# Altium footprint library custom.PcbLib: 317 footprints (part 6 of 20)
Each footprint in its own frame and in the unit in brackets; x right, y up, seen from the top. Pads: shape width x height; smd on the part's side, far side on the other; paste and mask are expansions set on the pad; w line width, h text height; cw(c..) or ccw(c..) is an arc to the next point about the centre after c.
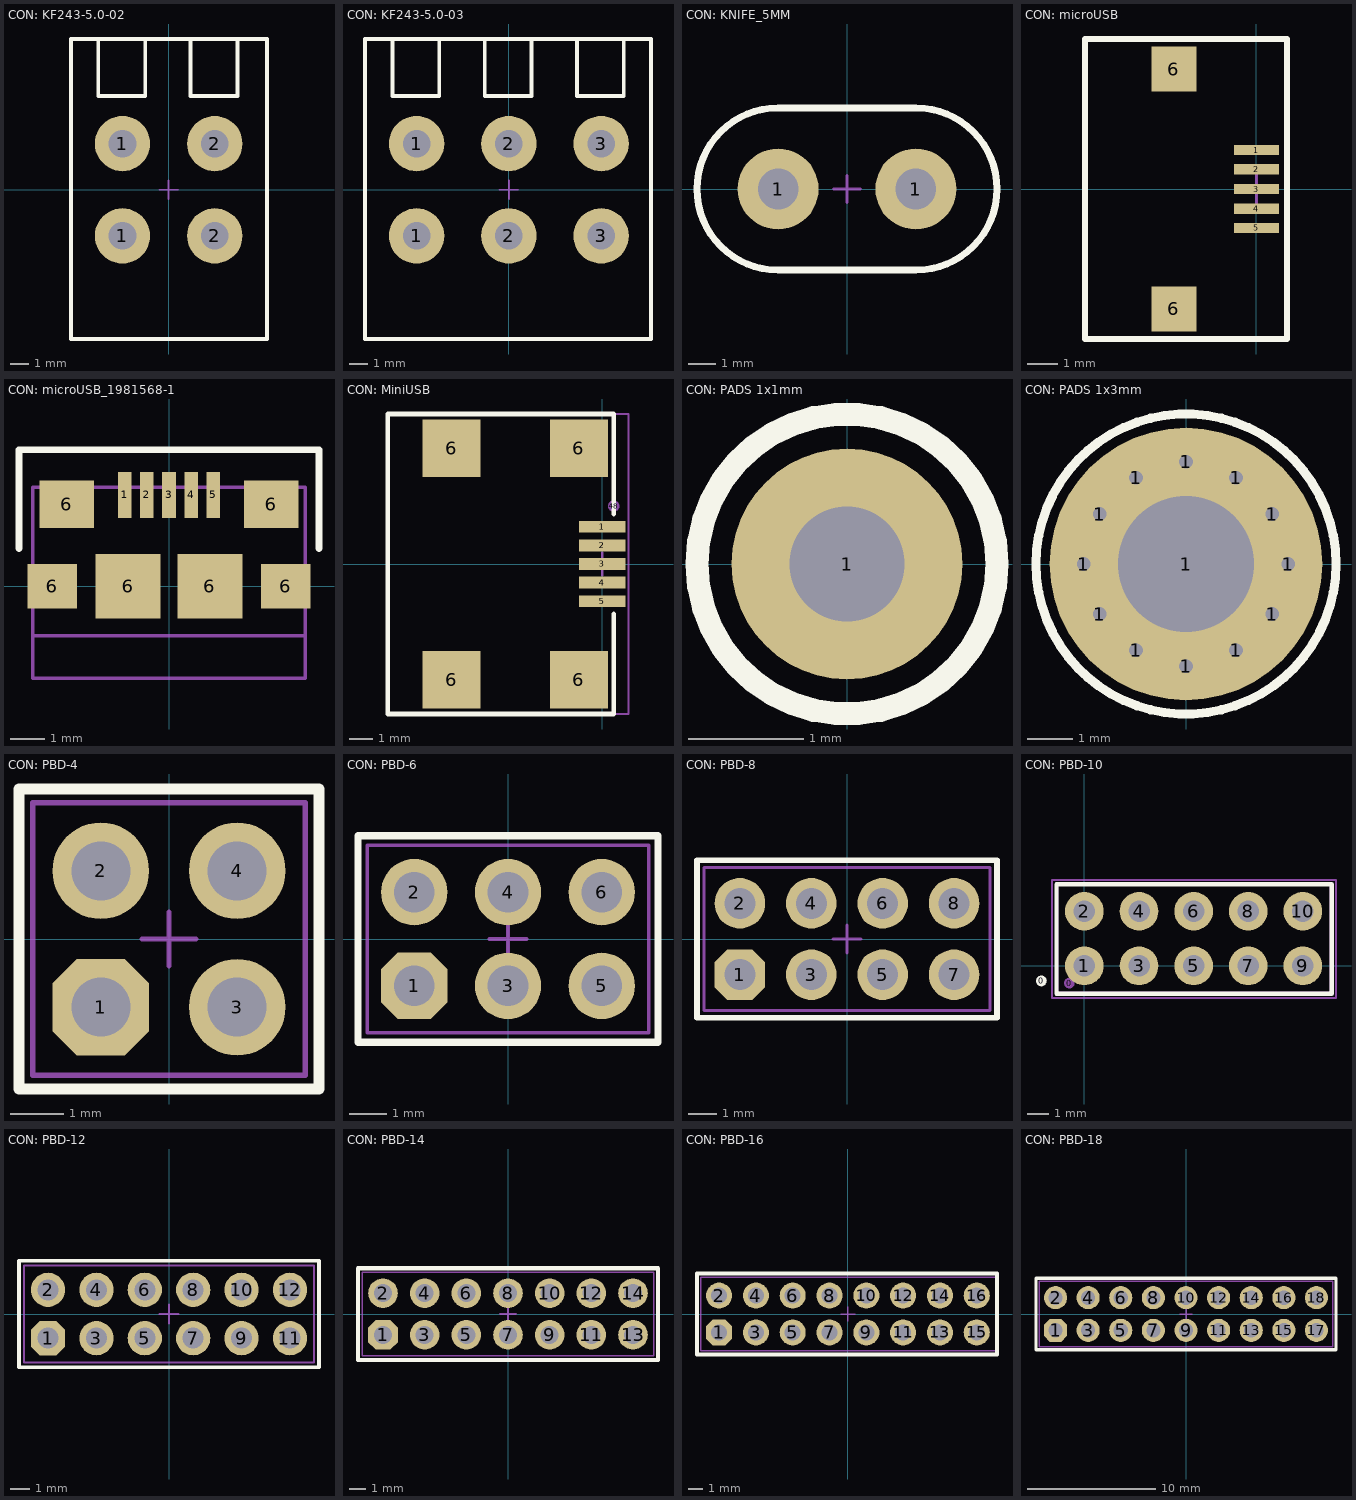
[diagram p5: the footprints below, top view; thin cyan lines are the x and y axes]

## CON: KF243-5.0-02 [mm]
height 30
pads (4):
  round 3 hole 1.5: 1(-2.5,-2.5) 1(-2.5,2.5) 2(2.5,-2.5) 2(2.5,2.5)
Top Overlay:
  lines w0.2: -3.81,8.168 -3.81,5.08 -1.27,5.08 -1.27,8.168 ; 1.19,8.168 1.19,5.08 3.73,5.08 3.73,8.168 ; -5.294,-8.088 5.334,-8.088 5.334,8.168 -5.294,8.168 -5.294,-8.088
Top Assy:
  lines w0.1: -3.81,8.168 -3.81,5.08 -1.27,5.08 -1.27,8.168 ; 1.19,8.168 1.19,5.08 3.73,5.08 3.73,8.168 ; -5.294,-8.088 -5.294,8.168 5.334,8.168 5.334,-8.088 -5.294,-8.088
Size Area:
  lines w0.1: -0.5,0 0.5,0 ; 0,-0.5 0,0.5 ; -5.294,-8.088 5.334,-8.088 5.334,8.168 -5.294,8.168 -5.294,-8.088
3D body "KF243.STEP": height 19.11, standoff 0, extent 0,-7.89 5,7.89
3D body "KF243.STEP": height 19.11, standoff 0, extent -5,-7.89 0,7.89

## CON: KF243-5.0-03 [mm]
height 30
pads (6):
  round 3 hole 1.5: 1(-5,-2.5) 1(-5,2.5) 2(0,-2.5) 2(0,2.5) 3(5,-2.5) 3(5,2.5)
Top Overlay:
  lines w0.2: -6.31,8.168 -6.31,5.08 -3.77,5.08 -3.77,8.168 ; -1.31,8.168 -1.31,5.08 1.23,5.08 1.23,8.168 ; 3.69,8.168 3.69,5.08 6.23,5.08 6.23,8.168 ; -7.794,-8.088 7.7,-8.088 7.7,8.168 -7.794,8.168 -7.794,-8.088
Top Assy:
  lines w0.1: -6.31,8.168 -6.31,5.08 -3.77,5.08 -3.77,8.168 ; -1.31,8.168 -1.31,5.08 1.23,5.08 1.23,8.168 ; 3.69,8.168 3.69,5.08 6.23,5.08 6.23,8.168 ; -7.794,-8.088 -7.794,8.168 7.7,8.168 7.7,-8.088 -7.794,-8.088
Size Area:
  lines w0.1: -0.5,0 0.5,0 ; 0,-0.5 0,0.5 ; -7.794,-8.088 7.7,-8.088 7.7,8.168 -7.794,8.168 -7.794,-8.088
3D body "KF243.STEP": height 19.11, standoff 0, extent 2.5,-7.89 7.5,7.89
3D body "KF243.STEP": height 19.11, standoff 0, extent -7.5,-7.89 -2.5,7.89
3D body "KF243.STEP": height 19.11, standoff 0, extent -2.5,-7.89 2.5,7.89

## CON: KNIFE_5MM [mm]
pads (2):
  round 3 hole 1.5: 1(-2.55,0) 1(2.55,0)
Top Overlay:
  lines w0.254: -2.55,-3 cw(c-2.55,0) -2.55,3 2.55,3 cw(c2.55,0) 2.55,-3 -2.55,-3
Top Assy:
  lines w0.05: -2.55,-3 cw(c-2.55,0) -2.55,3 2.55,3 cw(c2.55,0) 2.55,-3 -2.55,-3
Size Area:
  lines w0.05: -2.55,-3 cw(c-2.55,0) -2.55,3 2.55,3 cw(c2.55,0) 2.55,-3 -2.55,-3
  lines w0.1: -0.5,0 0.5,0 ; 0,-0.5 0,0.5
3D body "TA-M.STEP": height 10.2, standoff -3.7, extent -3.975,-0.375 3.925,0.425

## CON: microUSB [mm]
height 3
pads (7):
  rect 1.5x0.35 smd: 1(0,1.3) 2(0,0.65) 3(0,0) 4(0,-0.65) 5(0,-1.3)
  rect 1.5x1.5 smd: 6(-2.75,-4) 6(-2.75,4)
Top Overlay:
  lines w0.2: -5.715,-5 1.016,-5 1.016,5 -5.715,5 -5.715,-5
Top Assy:
  lines w0.1: -5.715,-5 1.016,-5 1.016,5 -5.715,5 -5.715,-5
Size Area:
  lines w0.1: -0.5,0 0.5,0 ; 0,-0.5 0,0.5 ; -5.715,-5 -5.715,5 1.016,5 1.016,-5 -5.715,-5
3D body "48284.stp": height 2.71, standoff -0.23, extent -5.5,-4.4 0.231,4.4

## CON: microUSB_1981568-1 [mm]
pads (11):
  rect 0.4x1.35 smd: 1(-1.3,2.675) 2(-0.65,2.675) 3(0,2.675) 4(0.65,2.675) 5(1.3,2.675)
  rect 1.45x1.3 smd: 6(-3.425,0) 6(3.425,0)
  rect 1.6x1.4 smd: 6(-3,2.4) 6(3,2.4)
  rect 1.9x1.9 smd: 6(-1.2,0) 6(1.2,0)
Top Overlay:
  lines w0.2: -4.4,1.1 -4.4,4 4.4,4 4.4,1.1
Top Assy:
  lines w0.1: -4,-1.45 4,-1.45 ; -4,-2.7 -4,2.9 4,2.9 4,-2.7 -4,-2.7
3D body "c-1981568-1-g-3d.stp": height 2.79, standoff -0.29, extent -4,-2.7 4,2.9

## CON: MiniUSB [mm] "Mini USB on-pcb connector, female"
height 4
pads (10):
  rect 2x0.5 smd: 1(0,1.6) 2(0,0.8) 3(0,0) 4(0,-0.8) 5(0,-1.6)
  rect 2.5x2.5 smd: 6(-6.5,-5) 6(-6.5,5) 6(-1,-5) 6(-1,5)
  round 0.5 on Mech1: 48(0.5,2.5)
Top Overlay:
  lines w0.2: 0.508,-2.159 0.508,-6.477 -9.25,-6.477 -9.25,6.477 0.508,6.477 0.508,2.159
Top Assy:
  lines w0.1: -9.271,-6.477 -9.271,6.477 1.143,6.477 1.143,-6.477 -9.271,-6.477
Size Area:
  lines w0.1: -0.5,0 0.5,0 ; 0,-0.5 0,0.5 ; -9.271,-6.477 1.143,-6.477 1.143,6.477 -9.271,6.477 -9.271,-6.477
3D body "1-1734035-1.stp": height 4.09, standoff -1, extent -9.4,-4.95 -0.2,4.95

## CON: PADS 1x1mm [mm]
pads (1):
  round 2 hole 1: 1(0,0)
Top Overlay:
  circle w0.2: c0,0 r1.3

## CON: PADS 1x3mm [mm]
pads (13):
  round 0.7 hole 0.3: 1(-2.25,0) 1(-1.9,-1.1) 1(-1.9,1.1) 1(-1.1,-1.9) 1(-1.1,1.9) 1(0,-2.25) 1(0,2.25) 1(1.1,-1.9) 1(1.1,1.9) 1(1.9,-1.1) 1(1.9,1.1) 1(2.25,0)
  round 6 hole 3: 1(0,0)
Top Overlay:
  circle w0.2: c0,0 r3.3

## CON: PBD-4 [mm] "PBD-4"
height 10
pads (4):
  oct 1.8x1.8 hole 1.1: 1(-1.27,-1.27)
  round 1.8 hole 1.1: 2(-1.27,1.27) 3(1.27,-1.27) 4(1.27,1.27)
Top Overlay:
  lines w0.2: -2.794,-2.794 -2.794,2.794 2.794,2.794 2.794,-2.794 -2.794,-2.794
Top Assy:
  lines w0.1: -2.54,-2.54 -2.54,2.54 2.54,2.54 2.54,-2.54 -2.54,-2.54
Size Area:
  lines w0.1: -0.5,0 0.5,0 ; 0,-0.5 0,0.5 ; -2.794,-2.794 2.794,-2.794 2.794,2.794 -2.794,2.794 -2.794,-2.794

## CON: PBD-6 [mm] "PBD-6"
height 10
pads (6):
  oct 1.8x1.8 hole 1.1: 1(-2.54,-1.27)
  round 1.8 hole 1.1: 2(-2.54,1.27) 3(0,-1.27) 4(0,1.27) 5(2.54,-1.27) 6(2.54,1.27)
Top Overlay:
  lines w0.2: -4.064,-2.794 -4.064,2.794 4.064,2.794 4.064,-2.794 -4.064,-2.794
Top Assy:
  lines w0.1: -3.81,-2.54 -3.81,2.54 3.81,2.54 3.81,-2.54 -3.81,-2.54
Size Area:
  lines w0.1: -0.5,0 0.5,0 ; 0,-0.5 0,0.5 ; -4.064,-2.794 4.064,-2.794 4.064,2.794 -4.064,2.794 -4.064,-2.794
3D body "PBD-6.STEP": height 8.5, standoff -3, extent -3.81,-2.54 3.81,2.54

## CON: PBD-8 [mm] "PBD-8"
height 10
pads (8):
  oct 1.8x1.8 hole 1.1: 1(-3.81,-1.27)
  round 1.8 hole 1.1: 2(-3.81,1.27) 3(-1.27,-1.27) 4(-1.27,1.27) 5(1.27,-1.27) 6(1.27,1.27) 7(3.81,-1.27) 8(3.81,1.27)
Top Overlay:
  lines w0.2: -5.334,-2.794 5.334,-2.794 5.334,2.794 -5.334,2.794 -5.334,-2.794
Top Assy:
  lines w0.1: -5.08,-2.54 5.08,-2.54 5.08,2.54 -5.08,2.54 -5.08,-2.54
Size Area:
  lines w0.1: -0.5,0 0.5,0 ; 0,-0.5 0,0.5 ; -5.334,-2.794 -5.334,2.794 5.334,2.794 5.334,-2.794 -5.334,-2.794
3D body "PBD-8.STEP": height 8.5, standoff -3, extent -5.08,-2.54 5.08,2.54

## CON: PBD-10 [mm]
pads (12):
  round 0.5 on Top Overlay: 0(-2,-0.7)
  round 0.5 on Mech1: 0(-0.7,-0.8)
  round 1.8 hole 1: 1(0,0) 2(0,2.54) 3(2.54,0) 4(2.54,2.54) 5(5.08,0) 6(5.08,2.54) 7(7.62,0) 8(7.62,2.54) 9(10.16,0) 10(10.16,2.54)
Top Overlay:
  lines w0.2: -1.3,-1.3 11.5,-1.3 11.5,3.8 -1.3,3.8 -1.3,-1.3
Top Assy:
  lines w0.1: -1.25,-1.24 -1.25,3.84 11.45,3.84 11.45,-1.24 -1.25,-1.24
Size Area:
  lines w0.1: -1.5,-1.5 11.7,-1.5 11.7,4 -1.5,4 -1.5,-1.5
3D body "User Library-PBD2_54-10.STEP": height 8.4, standoff -2.7, extent -1.25,-1.24 11.45,3.84

## CON: PBD-12 [mm] "PBD-12"
height 10
pads (12):
  oct 1.8x1.8 hole 1.1: 1(-6.35,-1.27)
  round 1.8 hole 1.1: 2(-6.35,1.27) 3(-3.81,-1.27) 4(-3.81,1.27) 5(-1.27,-1.27) 6(-1.27,1.27) 7(1.27,-1.27) 8(1.27,1.27) 9(3.81,-1.27) 10(3.81,1.27) 11(6.35,-1.27) 12(6.35,1.27)
Top Overlay:
  lines w0.2: -7.874,-2.794 -7.874,2.794 7.874,2.794 7.874,-2.794 -7.874,-2.794
Top Assy:
  lines w0.1: -7.62,-2.54 -7.62,2.54 7.62,2.54 7.62,-2.54 -7.62,-2.54
Size Area:
  lines w0.1: -0.5,0 0.5,0 ; 0,-0.5 0,0.5 ; -7.874,-2.794 7.874,-2.794 7.874,2.794 -7.874,2.794 -7.874,-2.794

## CON: PBD-14 [mm] "PBD-14"
height 10
pads (14):
  oct 1.8x1.8 hole 1.1: 1(-7.62,-1.27)
  round 1.8 hole 1.1: 2(-7.62,1.27) 3(-5.08,-1.27) 4(-5.08,1.27) 5(-2.54,-1.27) 6(-2.54,1.27) 7(0,-1.27) 8(0,1.27) 9(2.54,-1.27) 10(2.54,1.27) 11(5.08,-1.27) 12(5.08,1.27) 13(7.62,-1.27) 14(7.62,1.27)
Top Overlay:
  lines w0.254: -9.144,-2.794 9.144,-2.794 9.144,2.794 -9.144,2.794 -9.144,-2.794
Top Assy:
  lines w0.1: -8.89,-2.54 8.89,-2.54 8.89,2.54 -8.89,2.54 -8.89,-2.54
Size Area:
  lines w0.05: -9.144,-2.794 -9.144,2.794 9.144,2.794 9.144,-2.794 -9.144,-2.794
  lines w0.1: -0.5,0 0.5,0 ; 0,-0.5 0,0.5

## CON: PBD-16 [mm] "PBD-16"
height 10
pads (16):
  oct 1.8x1.8 hole 1.1: 1(-8.89,-1.27)
  round 1.8 hole 1.1: 2(-8.89,1.27) 3(-6.35,-1.27) 4(-6.35,1.27) 5(-3.81,-1.27) 6(-3.81,1.27) 7(-1.27,-1.27) 8(-1.27,1.27) 9(1.27,-1.27) 10(1.27,1.27) 11(3.81,-1.27) 12(3.81,1.27) 13(6.35,-1.27) 14(6.35,1.27) 15(8.89,-1.27) 16(8.89,1.27)
Top Overlay:
  lines w0.254: -10.414,-2.794 10.287,-2.794 10.287,2.794 -10.414,2.794 -10.414,-2.794
Top Assy:
  lines w0.1: -10.16,-2.54 10.287,-2.54 10.287,2.54 -10.16,2.54 -10.16,-2.54
Size Area:
  lines w0.05: -10.414,-2.794 -10.414,2.794 10.287,2.794 10.287,-2.794 -10.414,-2.794
  lines w0.1: -0.5,0 0.5,0 ; 0,-0.5 0,0.5
3D body "PBD-16.STEP": height 8.5, standoff -3, extent -10.16,-2.54 10.16,2.54

## CON: PBD-18 [mm] "PBD-18"
height 10
pads (18):
  oct 1.8x1.8 hole 1.1: 1(-10.16,-1.27)
  round 1.8 hole 1.1: 2(-10.16,1.27) 3(-7.62,-1.27) 4(-7.62,1.27) 5(-5.08,-1.27) 6(-5.08,1.27) 7(-2.54,-1.27) 8(-2.54,1.27) 9(0,-1.27) 10(0,1.27) 11(2.54,-1.27) 12(2.54,1.27) 13(5.08,-1.27) 14(5.08,1.27) 15(7.62,-1.27) 16(7.62,1.27) 17(10.16,-1.27) 18(10.16,1.27)
Top Overlay:
  lines w0.254: -11.684,-2.794 -11.684,2.794 11.684,2.794 11.684,-2.794 -11.684,-2.794
Top Assy:
  lines w0.1: -11.43,-2.54 -11.43,2.54 11.43,2.54 11.43,-2.54 -11.43,-2.54
Size Area:
  lines w0.05: -11.684,-2.794 11.684,-2.794 11.684,2.794 -11.684,2.794 -11.684,-2.794
  lines w0.1: -0.5,0 0.5,0 ; 0,-0.5 0,0.5
3D body "PBD-18.STEP": height 8.5, standoff -3, extent -11.43,-2.54 11.43,2.54